# Altium footprint library LibPCB.PcbLib: 76 footprints (part 1 of 5)
Each footprint in its own frame and in the unit in brackets; x right, y up, seen from the top. Pads: shape width x height; smd on the part's side, far side on the other; paste and mask are expansions set on the pad; w line width, h text height; cw(c..) or ccw(c..) is an arc to the next point about the centre after c.
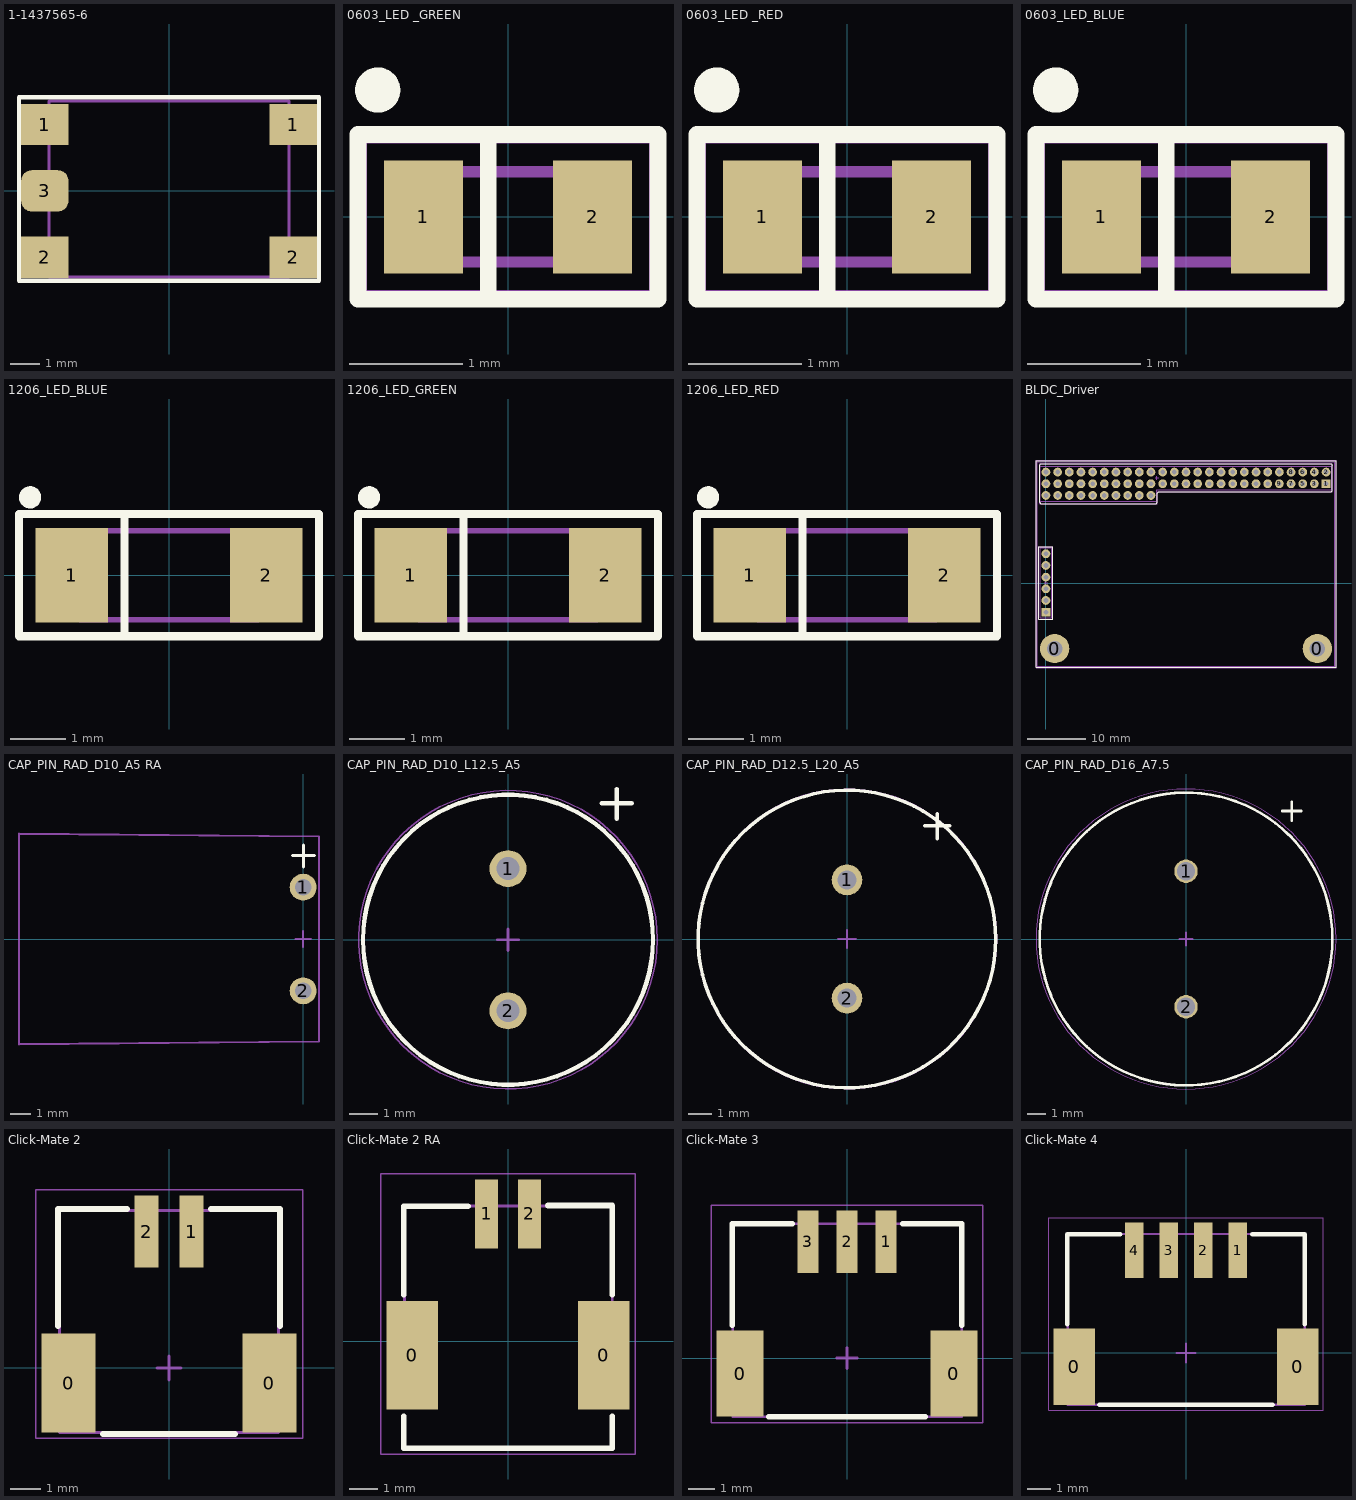
[diagram p0: the footprints below, top view; thin cyan lines are the x and y axes]

## 1-1437565-6 [mm] "Button smd"
height 1.2
pads (5):
  rect 1.6x1.395 smd: 1(-4.205,2.248) 1(4.205,2.248) 2(-4.205,-2.248) 2(4.205,-2.248)
  rrect50% 1.6x1.4 smd: 3(-4.205,0)
Top Overlay:
  lines w0.15: -5.08,-3.048 -5.08,3.175 5.08,3.175 5.08,-3.048 -5.08,-3.048
Mechanical 9:
  text ".Comment" at -1.016,-0.381 h0.6
  text ".Designator" at -1.397,0.254 h0.8
Mechanical 11:
  lines w0.1: -4.064,-2.921 -4.064,3.048 4.064,3.048 4.064,-2.921 -4.064,-2.921
Mechanical 15:
  lines w0.1: -5.08,-3.048 -5.08,3.175 5.08,3.175 5.08,-3.048 -5.08,-3.048
3D body "c-1-1437565-6-d1-3d.stp": height 3.1, standoff 0, extent -4,-3.1 4,3.1

## 0603_LED _GREEN [mm]
height 1.1
pads (2):
  rect 0.7x1 smd: 1(-0.75,0) 2(0.75,0)
Top Overlay:
  circle w0.2: c-1.155,1.125 r0.1
  lines w0.15: -0.175,-0.73 -0.175,0.73 ; -1.33,-0.73 1.33,-0.73 1.33,0.73 -1.33,0.73 -1.33,-0.73
Mechanical 9:
  text ".Designator" at -1.2,1.7 h0.8
  text ".Comment" at -0.8,1 h0.6
Mechanical 11:
  lines w0.1: -1.3,-0.7 1.3,-0.7 1.3,0.7 -1.3,0.7 -1.3,-0.7
Mechanical 15:
  lines w0.1: -0.7,-0.4 -0.7,0.4 ; -0.6,-0.4 -0.6,0.4 ; -0.5,-0.4 -0.5,0.4 ; -0.8,-0.4 -0.8,0.4 0.8,0.4 0.8,-0.4 -0.8,-0.4
3D body: height 0.25, standoff 0, extent -2.8,2.3 -2.8,2.3
3D body: height 0.25, standoff 0, extent -1.5,-0.8 -1.5,-0.8
3D body: height 0.25, standoff 0, extent -1.6,-0.7 -1.6,-0.7
3D body "cdled1608x06g.step": height 0.6, standoff 0, extent -0.8,-0.4 0.8,0.4

## 0603_LED _RED [mm]
height 1.1
pads (2):
  rect 0.7x1 smd: 1(-0.75,0) 2(0.75,0)
Top Overlay:
  circle w0.2: c-1.155,1.125 r0.1
  lines w0.15: -0.175,-0.73 -0.175,0.73 ; -1.33,-0.73 1.33,-0.73 1.33,0.73 -1.33,0.73 -1.33,-0.73
Mechanical 9:
  text ".Designator" at -1.2,1.7 h0.8
  text ".Comment" at -0.8,1 h0.6
Mechanical 11:
  lines w0.1: -1.3,-0.7 1.3,-0.7 1.3,0.7 -1.3,0.7 -1.3,-0.7
Mechanical 15:
  lines w0.1: -0.7,-0.4 -0.7,0.4 ; -0.6,-0.4 -0.6,0.4 ; -0.5,-0.4 -0.5,0.4 ; -0.8,-0.4 -0.8,0.4 0.8,0.4 0.8,-0.4 -0.8,-0.4
3D body "cdled1608x06r.step": height 0.6, standoff 0, extent -0.8,-0.4 0.8,0.4

## 0603_LED_BLUE [mm]
height 1.1
pads (2):
  rect 0.7x1 smd: 1(-0.75,0) 2(0.75,0)
Top Overlay:
  circle w0.2: c-1.155,1.125 r0.1
  lines w0.15: -0.175,-0.73 -0.175,0.73 ; -1.33,-0.73 -1.33,0.73 1.33,0.73 1.33,-0.73 -1.33,-0.73
Mechanical 9:
  text ".Comment" at -0.8,1 h0.6
  text ".Designator" at -1.2,1.7 h0.8
Mechanical 11:
  lines w0.1: -1.3,-0.7 -1.3,0.7 1.3,0.7 1.3,-0.7 -1.3,-0.7
Mechanical 15:
  lines w0.1: -0.7,-0.4 -0.7,0.4 ; -0.6,-0.4 -0.6,0.4 ; -0.5,-0.4 -0.5,0.4 ; -0.8,-0.4 0.8,-0.4 0.8,0.4 -0.8,0.4 -0.8,-0.4
3D body "cdled1608x06b.step": height 0.6, standoff 0, extent -0.8,-0.4 0.8,0.4

## 1206_LED_BLUE [mm]
height 1.1
pads (2):
  rect 1.3x1.7 smd: 1(-1.75,0) 2(1.75,0)
Top Overlay:
  circle w0.2: c-2.5,1.4 r0.1
  lines w0.15: -0.8,-1 -0.8,1 ; -2.7,-1.1 2.7,-1.1 2.7,1.1 -2.7,1.1 -2.7,-1.1
Mechanical 9:
  text ".Designator" at -1.2,2 h0.8
  text ".Comment" at -0.8,1.3 h0.6
Mechanical 11:
  lines w0.1: -1.6,-0.8 1.6,-0.8 1.6,0.8 -1.6,0.8 -1.6,-0.8
Mechanical 15:
  lines w0.1: 2.2,-0.6 2.2,0.6
3D body "cdled3216x08b.step": height 0.75, standoff 0, extent -1.6,-0.8 1.6,0.8

## 1206_LED_GREEN [mm]
height 1.1
pads (2):
  rect 1.3x1.7 smd: 1(-1.75,0) 2(1.75,0)
Top Overlay:
  circle w0.2: c-2.5,1.4 r0.1
  lines w0.15: -0.8,-1 -0.8,1 ; -2.7,-1.1 -2.7,1.1 2.7,1.1 2.7,-1.1 -2.7,-1.1
Mechanical 9:
  text ".Comment" at -0.8,1.3 h0.6
  text ".Designator" at -1.2,2 h0.8
Mechanical 11:
  lines w0.1: -1.6,-0.8 -1.6,0.8 1.6,0.8 1.6,-0.8 -1.6,-0.8
Mechanical 15:
  lines w0.1: 2.2,-0.6 2.2,0.6
3D body "cdled3216x08g.step": height 0.75, standoff 0, extent -1.6,-0.8 1.6,0.8

## 1206_LED_RED [mm]
height 1.1
pads (2):
  rect 1.3x1.7 smd: 1(-1.75,0) 2(1.75,0)
Top Overlay:
  circle w0.2: c-2.5,1.4 r0.1
  lines w0.15: -0.8,-1 -0.8,1 ; -2.7,-1.1 2.7,-1.1 2.7,1.1 -2.7,1.1 -2.7,-1.1
Mechanical 9:
  text ".Designator" at -1.2,2 h0.8
  text ".Comment" at -0.8,1.3 h0.6
Mechanical 11:
  lines w0.1: -1.6,-0.8 1.6,-0.8 1.6,0.8 -1.6,0.8 -1.6,-0.8
Mechanical 15:
  lines w0.1: 2.2,-0.6 2.2,0.6
3D body "cdled3216x08r.step": height 0.75, standoff 0, extent -1.6,-0.8 1.6,0.8

## BLDC_Driver [mm]
pads (68):
  round 5 hole 2.7: 0(1.5,-11.241) 0(46.5,-11.241)
  rect 1.5x1.5 hole 0.8: 1(48,17.009) 61(0,-4.991)
  round 1.5 hole 0.8: 2(48,19.009) 3(46,17.009) 4(46,19.009) 5(44,17.009) 6(44,19.009) 7(42,17.009) 8(42,19.009) 9(40,17.009) 10(40,19.009) 11(38,17.009) 12(38,19.009) 13(36,17.009) 14(36,19.009) 15(34,17.009) 16(34,19.009) 17(32,17.009) 18(32,19.009) 19(30,17.009) 20(30,19.009) 21(28,17.009) 22(28,19.009) 23(26,17.009) 24(26,19.009) 25(24,17.009) 26(24,19.009) 27(22,17.009) 28(22,19.009) 29(20,17.009) 30(20,19.009) 31(18,15.009) 32(18,17.009) 33(18,19.009) 34(16,15.009) 35(16,17.009) 36(16,19.009) 37(14,15.009) 38(14,17.009) 39(14,19.009) 40(12,15.009) 41(12,17.009) 42(12,19.009) 43(10,15.009) 44(10,17.009) 45(10,19.009) 46(8,15.009) 47(8,17.009) 48(8,19.009) 49(6,15.009) 50(6,17.009) 51(6,19.009) 52(4,15.009) 53(4,17.009) 54(4,19.009) 55(2,15.009) 56(2,17.009) 57(2,19.009) 58(0,15.009) 59(0,17.009) 60(0,19.009) 62(0,-2.991) 63(0,-0.991) 64(0,1.009) 65(0,3.009) 66(0,5.009)
Top Overlay:
  lines w0.2: -1.7,-14.441 -1.7,20.959 49.7,20.959 49.7,-14.441 -1.7,-14.441 ; -1.2,-6.191 1.2,-6.191 1.2,6.209 -1.2,6.209 -1.2,-6.191 ; -1.1,13.809 -1.1,20.209 -0.9,20.409 48.9,20.409 49.1,20.209 49.1,15.809 48.9,15.609 19.3,15.609 19.1,15.409 19.1,13.809 18.9,13.609 -0.9,13.609 -1.1,13.809
Mechanical 9:
  text ".Comment" at 20.8,3.409 h0.6
  text ".Designator" at 20.3,4.209 h0.8
Mechanical 11:
  lines w0.1: 15.1,20.009 -1,20.009 ; -1,20.009 49,20.009 49,16.009 19,16.009 19,14.009 -1,14.009 -1,20.009 ; -1.5,-14.241 -1.5,20.759 49.5,20.759 49.5,-14.241 -1.5,-14.241 ; -1,-5.991 1,-5.991 1,6.009 -1,6.009 -1,-5.991
Mechanical 15:
  lines w0.05: -1.7,-14.491 -1.7,21.009 49.7,21.009 49.7,-14.491 -1.7,-14.491 ; -1.2,-6.191 1.2,-6.191 1.2,6.209 -1.2,6.209 -1.2,-6.191
  lines w0.1: -0.3,0.009 0.3,0.009 ; 0,-0.291 0,0.309 ; 18.695,18.009 18.995,18.009 ; 18.995,17.709 18.995,18.009 ; 18.995,18.309 18.995,18.009 ; 19.295,18.009 18.995,18.009 ; -1.1,13.609 19.1,13.609 19.1,15.609 49.1,15.609 49.1,20.409 20.07,20.409 -1.1,20.409 -1.1,13.609
3D body "PBS2-3.STEP": height 4.3, standoff -3.15, extent -1,-5.991 1,0.009
3D body "PBS2-3.STEP": height 4.3, standoff -3.15, extent -1,0.009 1,6.009
3D body "PBD2-10.step": height 4.5, standoff -3.15, extent 39,16.009 49,20.009
3D body "PBD2-10.step": height 4.5, standoff -3.15, extent 29,16.009 39,20.009
3D body "PBD2-10.step": height 4.5, standoff -3.15, extent 19,16.009 29,20.009
3D body "PBD2-10.step": height 4.5, standoff -3.15, extent -1,14.009 9,18.009
3D body "PBD2-10.step": height 4.5, standoff -3.15, extent 9,14.009 19,18.009
3D body "PBD2-10.step": height 4.5, standoff -3.15, extent -1,16.009 9,20.009
3D body "PBD2-10.step": height 4.5, standoff -3.15, extent 9,16.009 19,20.009
3D body "BLDC_Driver.step": height 9.1, standoff 0.3, extent -1.5,-14.241 49.5,20.759

## CAP_PIN_RAD_D10_A5 RA [mm] "D10_A5_RA"
pads (2):
  round 1.3 hole 0.8: 1(0,2.5) 2(0,-2.5)
Top Overlay:
  lines w0.15: -0.51,4.038 0.54,4.038 ; 0.015,3.488 0.015,4.538
Mechanical 9:
  text ".Comment" at -0.7,-0.8 h0.6
  text ".Designator" at -0.4,0 h0.8
Mechanical 15:
  lines w0.1: -0.375,0 0.375,0 ; 0,-0.375 0,0.375 ; -13.716,-5.08 -13.716,5.08 0.762,4.953 0.762,-4.953 -13.716,-5.08
3D body "CAP 10x13.STEP": height 12, standoff 2, extent -13.8,-4.998 0.7,4.998

## CAP_PIN_RAD_D10_L12.5_A5 [mm] "D10_L12.5_A5"
pads (2):
  round 1.3 hole 0.8: 1(0,2.5) 2(0,-2.5)
Top Overlay:
  circle w0.15: c0,0 r5.1
  lines w0.15: 3.3,4.8 4.35,4.8 ; 3.825,4.25 3.825,5.3
Mechanical 7:
  circle w0.1: c0,0 r5.1
Mechanical 9:
  text ".Designator" at -0.4,0 h0.8
  text ".Comment" at -0.7,-0.8 h0.6
Mechanical 11:
  circle w0.1: c0,0 r5.1
Mechanical 15:
  circle w0.05: c0,0 r5.25
  lines w0.1: -0.375,0 0.375,0 ; 0,-0.375 0,0.375
3D body "CAP 10x13.STEP": height 13.8, standoff -0.7, extent -4.999,-4.998 4.998,4.998

## CAP_PIN_RAD_D12.5_L20_A5 [mm] "D12.5_L20_A5"
pads (2):
  round 1.3 hole 0.8: 1(0,2.5) 2(0,-2.5)
Top Overlay:
  circle w0.15: c0,0 r6.3
  lines w0.15: 3.3,4.8 4.35,4.8 ; 3.825,4.25 3.825,5.3
Mechanical 7:
  circle w0.1: c0,0 r6.3
Mechanical 9:
  text ".Comment" at -0.7,-0.8 h0.6
  text ".Designator" at -0.4,0 h0.8
Mechanical 11:
  circle w0.1: c0,0 r6.3
Mechanical 15:
  circle w0.05: c0,0 r6.35
  lines w0.1: -0.375,0 0.375,0 ; 0,-0.375 0,0.375
3D body "12.5x20.STEP": height 20.02, standoff -3, extent -6.25,-6.26 6.25,6.25

## CAP_PIN_RAD_D16_A7.5 [mm] "D16_A7.5"
pads (2):
  round 1.3 hole 1: 1(0,3.75) 2(0,-3.75)
Top Overlay:
  circle w0.15: c0,0 r8.1
  lines w0.15: 5.332,7.086 6.382,7.086 ; 5.857,6.536 5.857,7.586
Mechanical 7:
  circle w0.1: c0,0 r8.1
Mechanical 9:
  text ".Designator" at -0.4,0 h0.8
  text ".Comment" at -0.7,-0.8 h0.6
Mechanical 11:
  circle w0.1: c0,0 r8.1
Mechanical 15:
  circle w0.05: c0,0 r8.3
  lines w0.1: -0.375,0 0.375,0 ; 0,-0.375 0,0.375
3D body "16x25.step": height 26.4, standoff -2.5, extent -8.25,-8.25 8.25,8.25

## Click-Mate 2 [mm]
pads (4):
  rect 1.8x3.3 smd: 0(-3.35,-0.5) 0(3.35,-0.5)
  rect 0.8x2.4 smd: 1(0.75,4.55) 2(-0.75,4.55)
Top Overlay:
  lines w0.2: -3.7,1.4 -3.7,5.3 -1.4,5.3 ; -2.2,-2.2 2.2,-2.2 ; 1.4,5.3 3.7,5.3 3.7,1.4
Mechanical 9:
  text ".Designator" at -1.05,0.15 h0.8
  text ".Comment" at -0.925,-0.4 h0.6
Mechanical 11:
  lines w0.1: -3.65,-2.15 -3.65,5.25 3.65,5.25 3.65,-2.15 -3.65,-2.15
Mechanical 15:
  lines w0.05: -4.45,-2.35 -4.45,5.95 4.45,5.95 4.45,-2.35 -4.45,-2.35
  lines w0.1: -0.4,0 0.4,0 ; 0,-0.4 0,0.4
3D body "Click-Mate_2.stp": height 7.58, standoff 0.28, extent -3.65,-2.15 3.65,5.25

## Click-Mate 2 RA [mm]
pads (4):
  rect 1.8x3.8 smd: 0(-3.35,-0.5) 0(3.35,-0.5)
  rect 0.8x2.4 smd: 1(-0.75,4.45) 2(0.75,4.45)
Top Overlay:
  lines w0.2: -3.65,-2.625 -3.65,-3.75 3.65,-3.75 3.65,-2.625 ; -3.65,1.625 -3.65,4.725 -1.4,4.725 ; 1.4,4.75 3.65,4.75 3.65,1.625
Mechanical 7:
  lines w0.1: -3.65,-3.775 3.65,-3.775 ; -3.65,4.725 3.65,4.725 ; -3.625,-2.25 -3.625,4.725 ; 3.65,-2.25 3.65,4.75
Mechanical 15:
  lines w0.05: -4.45,-3.95 -4.45,5.85 4.45,5.85 4.45,-3.95 -4.45,-3.95
3D body "Click-Mate 2.stp": height 6.4, standoff 0, extent -3.65,-3.78 3.65,4.72

## Click-Mate 3 [mm] "5054050370"
pads (5):
  rect 1.8x3.3 smd: 0(-4.1,-0.6) 0(4.1,-0.6)
  rect 0.8x2.4 smd: 1(1.5,4.45) 2(0,4.45) 3(-1.5,4.45)
Top Overlay:
  lines w0.2: -4.4,1.25 -4.4,5.15 -2.1,5.15 ; -3,-2.25 3,-2.25 ; 2.125,5.15 4.4,5.15 4.4,1.25
Mechanical 9:
  text ".Designator" at -1.05,0.15 h0.8
  text ".Comment" at -0.925,-0.4 h0.6
Mechanical 11:
  lines w0.1: -4.375,-2.25 -4.375,5.15 4.4,5.15 4.4,-2.25 -4.375,-2.25
Mechanical 15:
  lines w0.05: -5.2,-2.475 -5.2,5.85 5.2,5.85 5.2,-2.475 -5.2,-2.475
  lines w0.1: -0.4,0 0.4,0 ; 0,-0.4 0,0.4
3D body "click-mate 3.stp": height 7.28, standoff -0.02, extent -4.4,-2.25 4.4,5.15

## Click-Mate 4 [mm] "5054050470"
pads (6):
  rect 1.8x3.3 smd: 0(-4.85,-0.6) 0(4.85,-0.6)
  rect 0.8x2.4 smd: 1(2.25,4.45) 2(0.75,4.45) 3(-0.75,4.45) 4(-2.25,4.45)
Top Overlay:
  lines w0.2: -5.15,1.25 -5.15,5.15 -2.85,5.15 ; -3.75,-2.25 3.75,-2.25 ; 2.875,5.15 5.15,5.15 5.15,1.25
Mechanical 9:
  text ".Comment" at -0.925,-0.4 h0.6
  text ".Designator" at -1.05,0.15 h0.8
Mechanical 11:
  lines w0.1: -5.125,-2.25 5.15,-2.25 5.15,5.15 -5.125,5.15 -5.125,-2.25
Mechanical 15:
  lines w0.05: -5.95,-2.475 5.95,-2.475 5.95,5.85 -5.95,5.85 -5.95,-2.475
  lines w0.1: -0.4,0 0.4,0 ; 0,-0.4 0,0.4
3D body "Clik-Mate 4.stp": height 7.28, standoff -0.02, extent -5.15,-2.25 5.15,5.15